# Altium footprint library FxPcbLib.PcbLib: 112 footprints (part 5 of 7)
Each footprint in its own frame and in the unit in brackets; x right, y up, seen from the top. Pads: shape width x height; smd on the part's side, far side on the other; paste and mask are expansions set on the pad; w line width, h text height; cw(c..) or ccw(c..) is an arc to the next point about the centre after c.
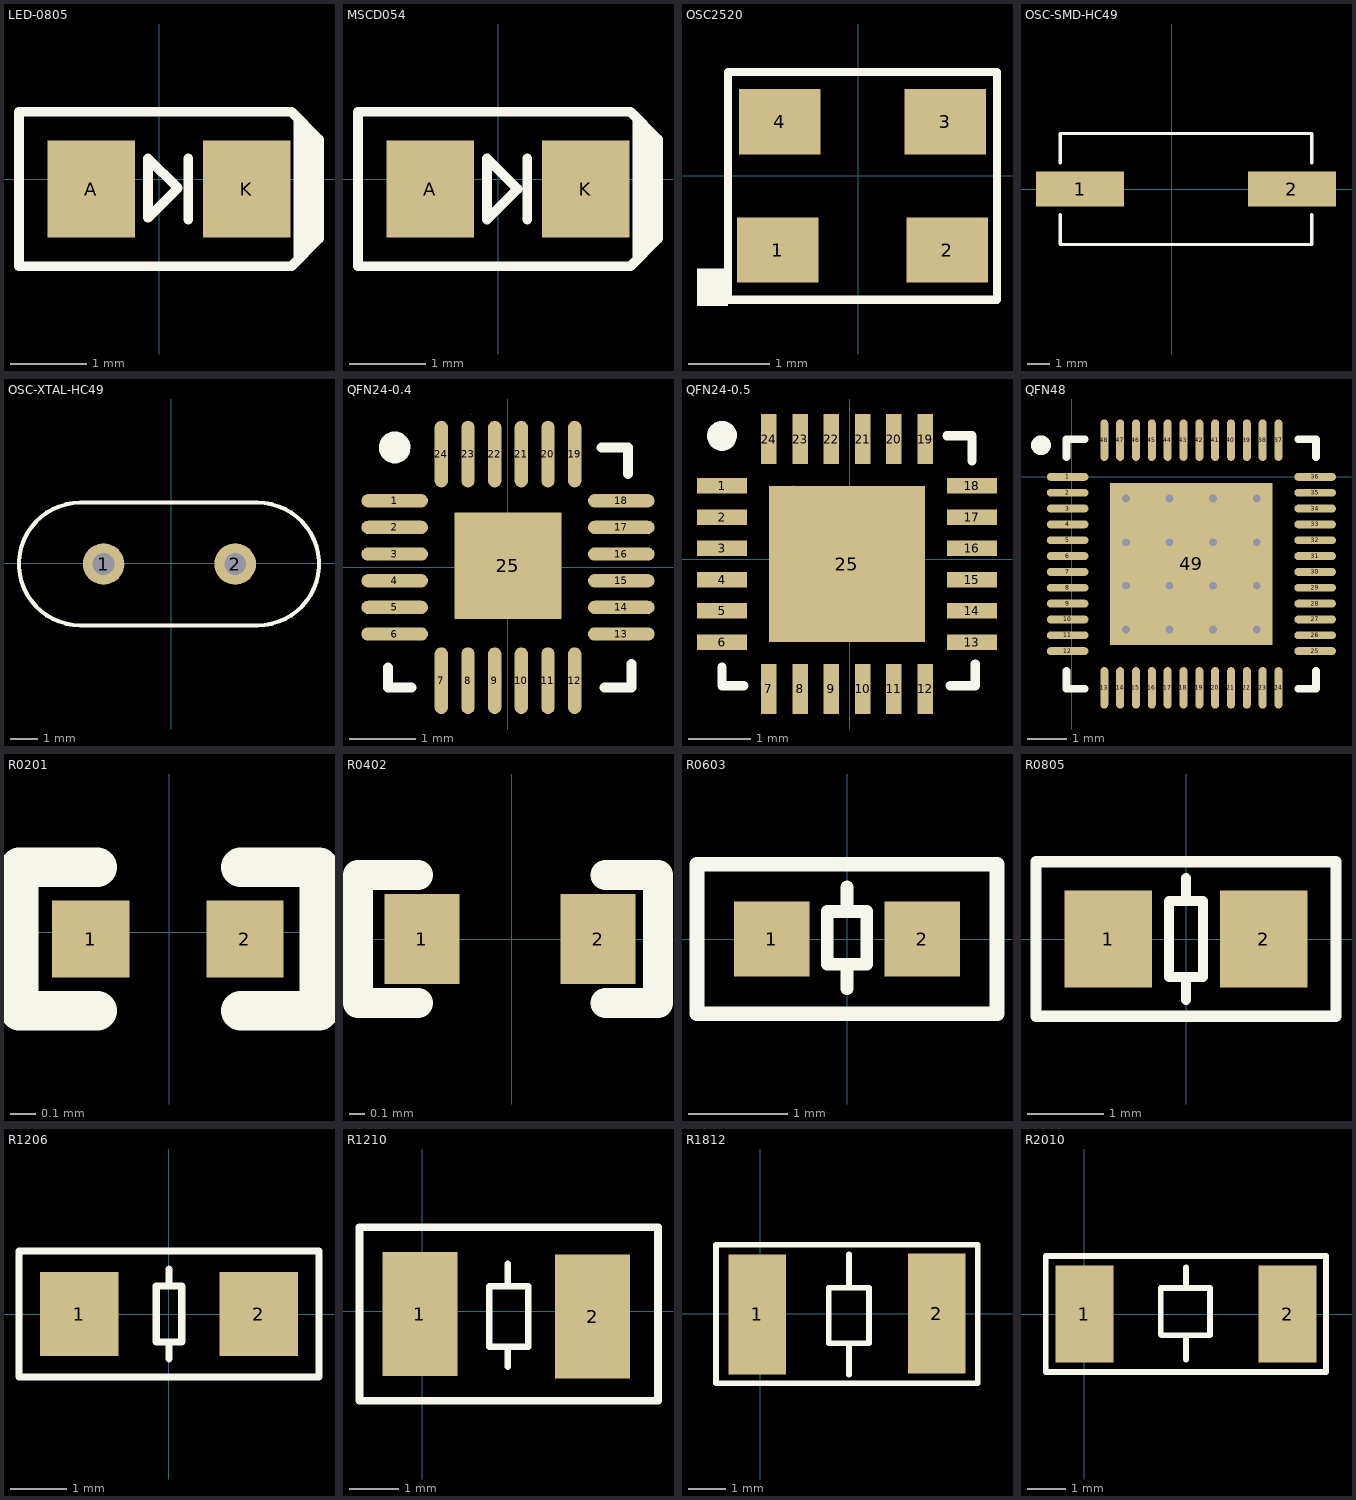
[diagram p4: the footprints below, top view; thin cyan lines are the x and y axes]

## LED-0805 [mil]
pads (2):
  rect 45x50 smd: A(-35,-5) K(45,-5)
Top Overlay:
  region: 79.8,-28.62 75.87,-28.62 75.87,-32.56 79.8,-32.56
  region: 77.83,-28.62 72.91,-28.62 72.91,-35.51 77.83,-35.51
  region: 74.88,-28.62 69.96,-28.62 69.96,-38.46 74.88,-38.46
  region: 71.93,-30.59 68.98,-30.59 68.98,-40.43 71.93,-40.43
  region: 73.9,30.43 68.98,30.43 68.98,27.48 73.9,27.48
  region: 79.8,23.54 73.9,23.54 73.9,18.62 79.8,18.62
  region: 76.85,27.48 68.98,27.48 68.98,20.59 76.85,20.59
  region: 82.17,20.59 68.98,20.59 68.98,-30.59 82.17,-30.59
  lines w5: 14.84,-20.75 14.84,10.75 ; -72.26,-44.76 -72.26,34.76 67.99,34.76 82.17,20.59 82.17,-30.59 67.99,-44.76 -72.26,-44.76 ; -5.83,-19.83 9.46,-4.54 -5.83,10.75 -5.83,-19.83
3D body: height 33.45, standoff 0.23, extent -35.6,-23 45.6,12.68

## MSCD054 [mil]
pads (2):
  rect 45x50 smd: A(-35,-5) K(45,-5)
Top Overlay:
  region: 79.8,-28.62 75.87,-28.62 75.87,-32.56 79.8,-32.56
  region: 77.83,-28.62 72.91,-28.62 72.91,-35.51 77.83,-35.51
  region: 74.88,-28.62 69.96,-28.62 69.96,-38.46 74.88,-38.46
  region: 71.93,-30.59 68.98,-30.59 68.98,-40.43 71.93,-40.43
  region: 73.9,30.43 68.98,30.43 68.98,27.48 73.9,27.48
  region: 79.8,23.54 73.9,23.54 73.9,18.62 79.8,18.62
  region: 76.85,27.48 68.98,27.48 68.98,20.59 76.85,20.59
  region: 82.17,20.59 68.98,20.59 68.98,-30.59 82.17,-30.59
  lines w5: 14.84,-20.75 14.84,10.75 ; -72.26,-44.76 -72.26,34.76 67.99,34.76 82.17,20.59 82.17,-30.59 67.99,-44.76 -72.26,-44.76 ; -5.83,-20.75 9.92,-5 -5.83,10.75 -5.83,-20.75
3D body: height 30.51, standoff -0.98, extent -34.37,-29.21 44.37,20

## OSC2520 [mm]
pads (4):
  rect 1x0.8 smd: 1(-0.991,-0.914) 2(1.092,-0.914) 3(1.067,0.66) 4(-0.965,0.66)
Top Overlay:
  rectangle: -1.981,-1.6 -1.6,-1.143
  lines w0.102: -1.6,-1.524 1.702,-1.524 1.702,1.27 -1.6,1.27 -1.6,-1.524
3D body: height 0.8, standoff -0.03, extent -1.199,-1.127 1.301,0.873

## OSC-SMD-HC49 [mm]
pads (2):
  rect 4x1.6 smd: 1(-4.165,0) 2(5.435,0)
Top Overlay:
  lines w0.152: -5.065,-1.168 -5.065,-2.515 6.335,-2.515 6.335,-1.168 ; -5.065,1.194 -5.065,2.515 6.335,2.515 6.335,1.194
3D body: height 4, standoff 0, extent -6.065,-2.462 7.335,2.438

## OSC-XTAL-HC49 [mil]
pads (2):
  round 60 hole 31.5: 1(-98,-1) 2(92,-1)
Top Overlay:
  lines w6: -131.53,-89.58 cw(c-131.53,-1) -131.53,87.58 124.38,87.58 cw(c124.38,-1) 124.38,-89.58 -131.53,-89.58
3D body: height 137.8, standoff -15, extent -226.43,-93 220.43,90.07

## QFN24-0.4 [mm]
pads (25):
  oval 1x0.2 smd: 1(-1.7,1) 2(-1.7,0.6) 3(-1.7,0.2) 4(-1.7,-0.2) 5(-1.7,-0.6) 6(-1.7,-1) 13(1.7,-1) 14(1.7,-0.6) 15(1.7,-0.2) 16(1.7,0.2) 17(1.7,0.6) 18(1.7,1)
  oval 0.2x1 smd: 7(-1,-1.7) 8(-0.6,-1.7) 9(-0.2,-1.7) 10(0.2,-1.7) 11(0.6,-1.7) 12(1,-1.7) 19(1,1.7) 20(0.6,1.7) 21(0.2,1.7) 22(-0.2,1.7) 23(-0.6,1.7) 24(-1,1.7)
  rect 1.6x1.6 smd paste+0 mask+0.15: 25(0,0.025)
Top Overlay:
  lines w0: -0.55,2.302 -0.55,2.302
  lines w0.15: -1.8,-1.5 -1.8,-1.8 -1.45,-1.8 ; 1.4,1.8 1.8,1.8 1.8,1.4 ; 1.45,-1.8 1.85,-1.8 1.85,-1.45
  lines w0.254: -1.6,1.75 cw(c-1.7,1.8) -1.588,1.8
3D body: height 1, standoff -0.05, extent -1.508,-1.501 1.512,1.519

## QFN24-0.5 [mm]
pads (25):
  rect 0.8x0.25 smd: 1(-2.046,1.173) 2(-2.046,0.673) 3(-2.046,0.173) 4(-2.046,-0.327) 5(-2.046,-0.827) 6(-2.046,-1.327) 13(1.954,-1.327) 14(1.954,-0.827) 15(1.954,-0.327) 16(1.954,0.173) 17(1.954,0.673) 18(1.954,1.173)
  rect 0.25x0.8 smd: 7(-1.296,-2.077) 8(-0.796,-2.077) 9(-0.296,-2.077) 10(0.204,-2.077) 11(0.704,-2.077) 12(1.204,-2.077) 19(1.204,1.923) 20(0.704,1.923) 21(0.204,1.923) 22(-0.296,1.923) 23(-0.796,1.923) 24(-1.296,1.923)
  rect 2.5x2.5 smd: 25(-0.046,-0.077)
Top Overlay:
  lines w0: -0.896,1.173 -0.896,1.173
  lines w0.15: -2.046,-1.727 -2.046,-2.027 -1.696,-2.027 ; 1.554,1.973 1.954,1.973 1.954,1.573 ; 1.604,-2.027 2.004,-2.027 2.004,-1.677
  lines w0.254: -1.946,1.923 cw(c-2.046,1.973) -1.934,1.973

## QFN48 [mm]
pads (49):
  oval 1.05x0.2 smd: 1(-0.1,0) 2(-0.1,-0.4) 3(-0.1,-0.8) 4(-0.1,-1.2) 5(-0.1,-1.6) 6(-0.1,-2) 7(-0.1,-2.4) 8(-0.1,-2.8) 9(-0.1,-3.2) 10(-0.1,-3.6) 11(-0.1,-4) 12(-0.1,-4.4) 25(6.154,-4.4) 26(6.154,-4) 27(6.154,-3.6) 28(6.154,-3.2) 29(6.154,-2.8) 30(6.154,-2.4) 31(6.154,-2) 32(6.154,-1.6) 33(6.154,-1.2) 34(6.154,-0.8) 35(6.154,-0.4) 36(6.154,0)
  oval 0.2x1.05 smd: 13(0.827,-5.327) 14(1.227,-5.327) 15(1.627,-5.327) 16(2.027,-5.327) 17(2.427,-5.327) 18(2.827,-5.327) 19(3.227,-5.327) 20(3.627,-5.327) 21(4.027,-5.327) 22(4.427,-5.327) 23(4.827,-5.327) 24(5.227,-5.327) 37(5.227,0.927) 38(4.827,0.927) 39(4.427,0.927) 40(4.027,0.927) 41(3.627,0.927) 42(3.227,0.927) 43(2.827,0.927) 44(2.427,0.927) 45(2.027,0.927) 46(1.627,0.927) 47(1.227,0.927) 48(0.827,0.927)
  rect 4.1x4.1 smd: 49(3.027,-2.2)
via 4.677,-3.85 diameter 0.5 hole 0.2
via 3.577,-3.85 diameter 0.5 hole 0.2
via 2.477,-3.85 diameter 0.5 hole 0.2
via 1.377,-3.85 diameter 0.5 hole 0.2
via 4.677,-2.75 diameter 0.5 hole 0.2
via 3.577,-2.75 diameter 0.5 hole 0.2
via 2.477,-2.75 diameter 0.5 hole 0.2
via 1.377,-2.75 diameter 0.5 hole 0.2
via 4.677,-1.65 diameter 0.5 hole 0.2
via 3.577,-1.65 diameter 0.5 hole 0.2
via 2.477,-1.65 diameter 0.5 hole 0.2
via 1.377,-1.65 diameter 0.5 hole 0.2
via 4.677,-0.55 diameter 0.5 hole 0.2
via 3.577,-0.55 diameter 0.5 hole 0.2
via 2.477,-0.55 diameter 0.5 hole 0.2
via 1.377,-0.55 diameter 0.5 hole 0.2
Top Overlay:
  circle w0.25: c-0.773,0.8 r0.125
  lines w0.2: -0.123,-4.9 -0.123,-5.35 0.327,-5.35 ; -0.123,0.5 -0.123,0.95 0.327,0.95 ; 5.727,-5.35 6.177,-5.35 6.177,-4.9 ; 5.727,0.95 6.177,0.95 6.177,0.5
3D body: height 0.85, standoff -0.02, extent 0.003,-5.227 6.043,0.813

## R0201 [mm]
pads (2):
  rect 0.3x0.3 smd: 1(-0.305,-0.025) 2(0.295,-0.025)
Top Overlay:
  lines w0.152: -0.279,-0.305 -0.584,-0.305 -0.584,0.254 -0.279,0.254 ; 0.279,-0.305 0.584,-0.305 0.584,0.254 0.279,0.254
3D body: height 0.34, standoff 0, extent -0.34,-0.19 0.34,0.14

## R0402 [mm]
pads (2):
  rect 0.5x0.6 smd: 1(-0.6,0) 2(0.575,0)
Top Overlay:
  lines w0.2: -0.625,-0.425 -1.025,-0.425 -1.025,0.425 -0.625,0.425 ; 0.625,-0.425 0.975,-0.425 0.975,0.425 0.625,0.425
3D body: height 0.34, standoff 0, extent -0.52,-0.3 0.52,0.3

## R0603 [mil]
pads (2):
  rect 30x30 smd: 1(-30,0) 2(30,0)
Top Overlay:
  lines w5.12: 0,-19.8 0,-10.06 ; 0,10.94 0,20.67 ; -7.87,-10.06 -7.87,10.94 7.87,10.94 7.87,-10.06 -7.87,-10.06
  lines w5.91: -59.76,-29.76 -59.76,29.76 59.76,29.76 59.76,-29.76 -59.76,-29.76
3D body: height 17.72, standoff 0, extent -31.5,-16.5 31.5,15

## R0805 [mil]
pads (2):
  rect 45x50 smd: 1(-40,0) 2(40,0)
Top Overlay:
  lines w5.12: 0,-31.5 0,-19.68 ; 0,19.69 0,31.5 ; -8.86,-19.68 8.86,-19.68 8.86,19.69 -8.86,19.69 -8.86,-19.68
  lines w5.91: -77.26,-39.76 77.26,-39.76 77.26,39.76 -77.26,39.76 -77.26,-39.76
3D body: height 21.65, standoff 0, extent -38.66,-25.71 40.08,23.9

## R1206 [mm]
pads (2):
  rect 1.4x1.5 smd: 1(-1.6,0) 2(1.6,0)
Top Overlay:
  lines w0.127: -2.675,-1.125 -2.675,1.125 2.675,1.125 2.675,-1.125 -2.675,-1.125
  lines w0.13: 0,-0.8 0,-0.5 ; 0,0.5 0,0.8 ; -0.225,-0.5 0.225,-0.5 0.225,0.5 -0.225,0.5 -0.225,-0.5
3D body: height 0.6, standoff 0, extent -1.625,-0.775 1.575,0.825

## R1210 [mm]
pads (2):
  rect 1.52x2.5 smd: 1(-0.051,-0.051) 2(3.43,-0.102)
Top Overlay:
  lines w0.13: 1.724,-1.118 1.724,-0.711 ; 1.724,0.584 1.724,0.965 ; 1.346,-0.711 1.346,0.508 2.134,0.508 2.134,-0.711 1.346,-0.711
  lines w0.152: -1.27,-1.803 4.75,-1.803 4.75,1.702 -1.27,1.702 -1.27,-1.803
3D body: height 0.6, standoff 0, extent 0.077,-1.326 3.277,1.174

## R1812 [mm]
pads (2):
  rect 1.52x3.2 smd: 1(-0.076,-0.025) 2(4.7,0)
Top Overlay:
  lines w0.152: 2.362,-1.625 2.362,-0.813 ; 2.362,0.737 2.362,1.575 ; -1.168,-1.854 5.791,-1.854 5.791,1.829 -1.168,1.829 -1.168,-1.854 ; 1.829,-0.787 2.896,-0.787 2.896,0.686 1.829,0.686 1.829,-0.787
3D body: height 1.6, standoff 0, extent 0.011,-1.625 4.511,1.575

## R2010 [mm]
pads (2):
  rect 1.52x2.54 smd: 1(0,0) 2(5.34,0)
Top Overlay:
  lines w0.152: 2.667,-1.194 2.667,-0.559 ; 2.667,0.737 2.667,1.219 ; -1.016,-1.524 -1.016,1.524 6.35,1.524 6.35,-1.524 -1.016,-1.524 ; 2.007,-0.533 2.007,0.686 3.302,0.686 3.302,-0.559 2.032,-0.559 2.007,-0.533
3D body: height 0.6, standoff 0, extent 0.167,-1.25 5.167,1.25